# Altium footprint library Elettronica FM.PcbLib: 387 footprints (part 16 of 25)
Each footprint in its own frame and in the unit in brackets; x right, y up, seen from the top. Pads: shape width x height; smd on the part's side, far side on the other; paste and mask are expansions set on the pad; w line width, h text height; cw(c..) or ccw(c..) is an arc to the next point about the centre after c.
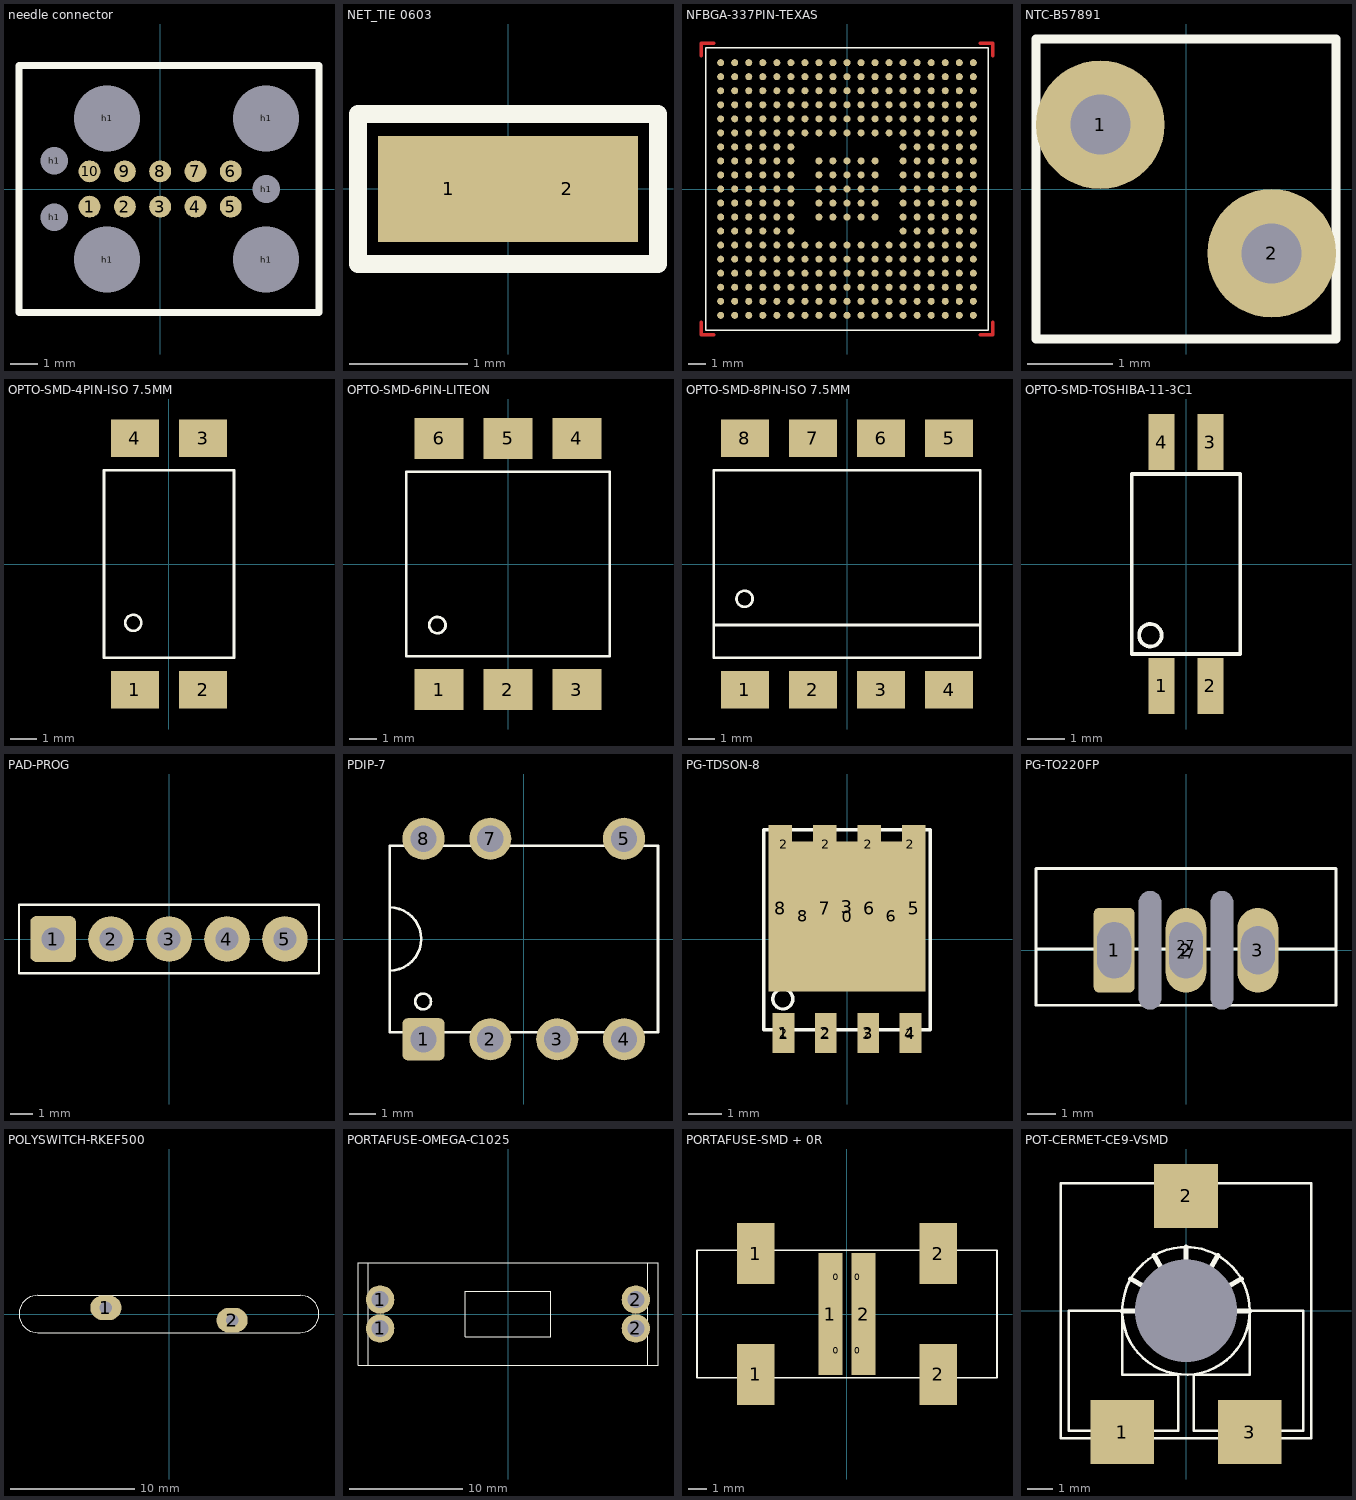
[diagram p15: the footprints below, top view; thin cyan lines are the x and y axes]

## needle connector [mil]
height 590.55
pads (17):
  round 31 smd mask+0: 1(-100,-25) 2(-50,-25) 3(0,-25) 4(50,-25) 5(100,-25) 6(100,25) 7(50,25) 8(0,25) 9(-50,25) 10(-100,25)
  round 19.68 hole 39 unplated: h1(-150,-40) h1(-150,40) h1(150,0)
  round 19.68 hole 93.5 unplated: h1(-75,100) h1(-75,-100) h1(150,-100) h1(150,100)
Top Overlay:
  lines w10: -200,-175 225,-175 225,175 -200,175 -200,-175

## NET_TIE 0603 [mm]
height 40.5
pads (2):
  rect 1.2x0.9 smd: 1(-0.5,0) 2(0.5,0)
Top Overlay:
  lines w0.15: -1.27,-0.635 -1.27,0.635 1.27,0.635 1.27,-0.635 -1.27,-0.635

## NFBGA-337PIN-TEXAS [mm]
height 16.6
pads (337):
  round 0.4 smd paste+0 mask+0.05: A1(-7.2,7.2) A2(-6.4,7.2) A3(-5.6,7.2) A4(-4.8,7.2) A5(-4,7.2) A6(-3.2,7.2) A7(-2.4,7.2) A8(-1.6,7.2) A9(-0.8,7.2) A10(0,7.2) A11(0.8,7.2) A12(1.6,7.2) A13(2.4,7.2) A14(3.2,7.2) A15(4,7.2) A16(4.8,7.2) A17(5.6,7.2) A18(6.4,7.2) A19(7.2,7.2) B1(-7.2,6.4) B2(-6.4,6.4) B3(-5.6,6.4) B4(-4.8,6.4) B5(-4,6.4) B6(-3.2,6.4) B7(-2.4,6.4) B8(-1.6,6.4) B9(-0.8,6.4) B10(0,6.4) B11(0.8,6.4) B12(1.6,6.4) B13(2.4,6.4) B14(3.2,6.4) B15(4,6.4) B16(4.8,6.4) B17(5.6,6.4) B18(6.4,6.4) B19(7.2,6.4) C1(-7.2,5.6) C2(-6.4,5.6) C3(-5.6,5.6) C4(-4.8,5.6) C5(-4,5.6) C6(-3.2,5.6) C7(-2.4,5.6) C8(-1.6,5.6) C9(-0.8,5.6) C10(0,5.6) C11(0.8,5.6) C12(1.6,5.6) C13(2.4,5.6) C14(3.2,5.6) C15(4,5.6) C16(4.8,5.6) C17(5.6,5.6) C18(6.4,5.6) C19(7.2,5.6) D1(-7.2,4.8) D2(-6.4,4.8) D3(-5.6,4.8) D4(-4.8,4.8) D5(-4,4.8) D6(-3.2,4.8) D7(-2.4,4.8) D8(-1.6,4.8) D9(-0.8,4.8) D10(0,4.8) D11(0.8,4.8) D12(1.6,4.8) D13(2.4,4.8) D14(3.2,4.8) D15(4,4.8) D16(4.8,4.8) D17(5.6,4.8) D18(6.4,4.8) D19(7.2,4.8) E1(-7.2,4) E2(-6.4,4) E3(-5.6,4) E4(-4.8,4) E5(-4,4) E6(-3.2,4) E7(-2.4,4) E8(-1.6,4) E9(-0.8,4) E10(0,4) E11(0.8,4) E12(1.6,4) E13(2.4,4) E14(3.2,4) E15(4,4) E16(4.8,4) E17(5.6,4) E18(6.4,4) E19(7.2,4) F1(-7.2,3.2) F2(-6.4,3.2) F3(-5.6,3.2) F4(-4.8,3.2) F5(-4,3.2) F6(-3.2,3.2) F7(-2.4,3.2) F8(-1.6,3.2) F9(-0.8,3.2) F10(0,3.2) F11(0.8,3.2) F12(1.6,3.2) F13(2.4,3.2) F14(3.2,3.2) F15(4,3.2) F16(4.8,3.2) F17(5.6,3.2) F18(6.4,3.2) F19(7.2,3.2) G1(-7.2,2.4) G2(-6.4,2.4) G3(-5.6,2.4) G4(-4.8,2.4) G5(-4,2.4) G6(-3.2,2.4) G14(3.2,2.4) G15(4,2.4) G16(4.8,2.4) G17(5.6,2.4) G18(6.4,2.4) G19(7.2,2.4) H1(-7.2,1.6) H2(-6.4,1.6) H3(-5.6,1.6) H4(-4.8,1.6) H5(-4,1.6) H6(-3.2,1.6) H8(-1.6,1.6) H9(-0.8,1.6) H10(0,1.6) H11(0.8,1.6) H12(1.6,1.6) H14(3.2,1.6) H15(4,1.6) H16(4.8,1.6) H17(5.6,1.6) H18(6.4,1.6) H19(7.2,1.6) J1(-7.2,0.8) J2(-6.4,0.8) J3(-5.6,0.8) J4(-4.8,0.8) J5(-4,0.8) J6(-3.2,0.8) J8(-1.6,0.8) J9(-0.8,0.8) J10(0,0.8) J11(0.8,0.8) J12(1.6,0.8) J14(3.2,0.8) J15(4,0.8) J16(4.8,0.8) J17(5.6,0.8) J18(6.4,0.8) J19(7.2,0.8) K1(-7.2,0) K2(-6.4,0) K3(-5.6,0) K4(-4.8,0) K5(-4,0) K6(-3.2,0) K8(-1.6,0) K9(-0.8,0) K10(0,0) K11(0.8,0) K12(1.6,0) K14(3.2,0) K15(4,0) K16(4.8,0) K17(5.6,0) K18(6.4,0) K19(7.2,0) L1(-7.2,-0.8) L2(-6.4,-0.8) L3(-5.6,-0.8) L4(-4.8,-0.8) L5(-4,-0.8) L6(-3.2,-0.8) L8(-1.6,-0.8) L9(-0.8,-0.8) L10(0,-0.8) L11(0.8,-0.8) L12(1.6,-0.8) L14(3.2,-0.8) L15(4,-0.8) L16(4.8,-0.8) L17(5.6,-0.8) L18(6.4,-0.8) L19(7.2,-0.8) M1(-7.2,-1.6) M2(-6.4,-1.6) M3(-5.6,-1.6) M4(-4.8,-1.6) M5(-4,-1.6) M6(-3.2,-1.6) M8(-1.6,-1.6) M9(-0.8,-1.6) M10(0,-1.6) M11(0.8,-1.6) M12(1.6,-1.6) M14(3.2,-1.6) M15(4,-1.6) M16(4.8,-1.6) M17(5.6,-1.6) M18(6.4,-1.6) M19(7.2,-1.6) N1(-7.2,-2.4) N2(-6.4,-2.4) N3(-5.6,-2.4) N4(-4.8,-2.4) N5(-4,-2.4) N6(-3.2,-2.4) N14(3.2,-2.4) N15(4,-2.4) N16(4.8,-2.4) N17(5.6,-2.4) N18(6.4,-2.4) N19(7.2,-2.4) P1(-7.2,-3.2) P2(-6.4,-3.2) P3(-5.6,-3.2) P4(-4.8,-3.2) P5(-4,-3.2) P6(-3.2,-3.2) P7(-2.4,-3.2) P8(-1.6,-3.2) P9(-0.8,-3.2) P10(0,-3.2) P11(0.8,-3.2) P12(1.6,-3.2) P13(2.4,-3.2) P14(3.2,-3.2) P15(4,-3.2) P16(4.8,-3.2) P17(5.6,-3.2) P18(6.4,-3.2) P19(7.2,-3.2) R1(-7.2,-4) R2(-6.4,-4) R3(-5.6,-4) R4(-4.8,-4) R5(-4,-4) R6(-3.2,-4) R7(-2.4,-4) R8(-1.6,-4) R9(-0.8,-4) R10(0,-4) R11(0.8,-4) R12(1.6,-4) R13(2.4,-4) R14(3.2,-4) R15(4,-4) R16(4.8,-4) R17(5.6,-4) R18(6.4,-4) R19(7.2,-4) T1(-7.2,-4.8) T2(-6.4,-4.8) T3(-5.6,-4.8) T4(-4.8,-4.8) T5(-4,-4.8) T6(-3.2,-4.8) T7(-2.4,-4.8) T8(-1.6,-4.8) T9(-0.8,-4.8) T10(0,-4.8) T11(0.8,-4.8) T12(1.6,-4.8) T13(2.4,-4.8) T14(3.2,-4.8) T15(4,-4.8) T16(4.8,-4.8) T17(5.6,-4.8) T18(6.4,-4.8) T19(7.2,-4.8) U1(-7.2,-5.6) U2(-6.4,-5.6) U3(-5.6,-5.6) U4(-4.8,-5.6) U5(-4,-5.6) U6(-3.2,-5.6) U7(-2.4,-5.6) U8(-1.6,-5.6) U9(-0.8,-5.6) U10(0,-5.6) U11(0.8,-5.6) U12(1.6,-5.6) U13(2.4,-5.6) U14(3.2,-5.6) U15(4,-5.6) U16(4.8,-5.6) U17(5.6,-5.6) U18(6.4,-5.6) U19(7.2,-5.6) V1(-7.2,-6.4) V2(-6.4,-6.4) V3(-5.6,-6.4) V4(-4.8,-6.4) V5(-4,-6.4) V6(-3.2,-6.4) V7(-2.4,-6.4) V8(-1.6,-6.4) V9(-0.8,-6.4) V10(0,-6.4) V11(0.8,-6.4) V12(1.6,-6.4) V13(2.4,-6.4) V14(3.2,-6.4) V15(4,-6.4) V16(4.8,-6.4) V17(5.6,-6.4) V18(6.4,-6.4) V19(7.2,-6.4) W1(-7.2,-7.2) W2(-6.4,-7.2) W3(-5.6,-7.2) W4(-4.8,-7.2) W5(-4,-7.2) W6(-3.2,-7.2) W7(-2.4,-7.2) W8(-1.6,-7.2) W9(-0.8,-7.2) W10(0,-7.2) W11(0.8,-7.2) W12(1.6,-7.2) W13(2.4,-7.2) W14(3.2,-7.2) W15(4,-7.2) W16(4.8,-7.2) W17(5.6,-7.2) W18(6.4,-7.2) W19(7.2,-7.2)
Top Layer:
  lines w0.2: -8.3,-7.6 -8.3,-8.3 -7.6,-8.3 ; -8.3,7.6 -8.3,8.3 -7.6,8.3 ; 7.6,-8.3 8.3,-8.3 8.3,-7.6 ; 7.6,8.3 8.3,8.3 8.3,7.6
Top Overlay:
  lines w0.1: -8.05,-8.05 8.05,-8.05 8.05,8.05 -8.05,8.05 -8.05,-8.05
Top Solder:
  region: -7.35,-8.55 -7.35,-8.05 -8.05,-8.05 -8.05,-7.35 -8.55,-7.35 -8.55,-8.55
  region: 7.35,8.55 7.35,8.05 8.05,8.05 8.05,7.35 8.55,7.35 8.55,8.55
  region: -8.55,7.35 -8.05,7.35 -8.05,8.05 -7.35,8.05 -7.35,8.55 -8.55,8.55
  region: 8.55,-7.35 8.05,-7.35 8.05,-8.05 7.35,-8.05 7.35,-8.55 8.55,-8.55
3D body: height 1.4, standoff 0.45, extent -8.05,-8.05 8.05,8.05

## NTC-B57891 [mm]
pads (2):
  round 1.5 hole 0.7: 1(-1,0.75) 2(1,-0.75)
Top Overlay:
  lines w0.1: -1.75,-1.75 -1.75,1.75 1.75,1.75 1.75,-1.75 -1.75,-1.75

## OPTO-SMD-4PIN-ISO 7.5MM [mm]
pads (4):
  rect 1.8x1.4 smd: 1(-1.27,-4.7) 2(1.27,-4.7) 3(1.27,4.7) 4(-1.27,4.7)
Top Overlay:
  circle w0.1: c-1.333,-2.195 r0.3
  lines w0.1: -2.425,-3.5 -2.425,3.5 2.425,3.5 2.425,-3.5 -2.425,-3.5
3D body: height 4.6, standoff 0.6, extent -2.425,-3.5 2.425,3.5

## OPTO-SMD-6PIN-LITEON [mm]
pads (6):
  rect 1.8x1.5 smd: 1(-2.54,-4.625) 2(0,-4.625) 3(2.54,-4.625) 4(2.54,4.625) 5(0,4.625) 6(-2.54,4.625)
Top Overlay:
  circle w0.1: c-2.6,-2.25 r0.3
  lines w0.1: -3.75,-3.4 -3.75,3.4 3.75,3.4 3.75,-3.4 -3.75,-3.4
3D body: height 5.1, standoff 0.6, extent -3.75,-3.4 3.75,3.4

## OPTO-SMD-8PIN-ISO 7.5MM [mm]
pads (8):
  rect 1.8x1.4 smd: 1(-3.81,-4.7) 2(-1.27,-4.7) 3(1.27,-4.7) 4(3.81,-4.7) 5(3.81,4.7) 6(1.27,4.7) 7(-1.27,4.7) 8(-3.81,4.7)
Top Overlay:
  circle w0.1: c-3.825,-1.3 r0.3
  lines w0.1: -4.975,-2.275 4.975,-2.275 ; -4.975,-3.5 -4.975,3.5 4.975,3.5 4.975,-3.5 -4.975,-3.5
3D body: height 4.6, standoff 0.6, extent -4.965,-3.5 4.975,3.5

## OPTO-SMD-TOSHIBA-11-3C1 [mm]
pads (4):
  rect 0.7x1.5 smd: 1(-0.65,-3.25) 2(0.65,-3.25) 3(0.65,3.25) 4(-0.65,3.25)
Top Overlay:
  circle w0.1: c-0.95,-1.9 r0.3
  lines w0.1: -1.45,-2.4 1.45,-2.4 1.45,2.4 -1.45,2.4 -1.45,-2.4
3D body: height 2.2, standoff 0.1, extent -1.45,-2.4 1.45,2.4

## PAD-PROG [mm]
height 16
pads (5):
  rrect25% 2x2 hole 1 mask+0.1: 1(-5.08,0)
  round 2 hole 1 mask+0.1: 2(-2.54,0) 3(0,0) 4(2.54,0) 5(5.08,0)
Top Overlay:
  lines w0.1: -6.575,-1.5 -6.575,1.5 6.575,1.5 6.575,-1.5 -6.575,-1.5
Bottom Overlay:
  lines w0.1: -6.575,-1.5 6.575,-1.5 6.575,1.5 -6.575,1.5 -6.575,-1.5

## PDIP-7 [mm]
height 8.5
pads (7):
  rrect25% 1.6x1.6 hole 1: 1(-3.81,-3.81)
  round 1.6 hole 1: 2(-1.27,-3.81) 3(1.27,-3.81) 4(3.81,-3.81) 5(3.81,3.81) 7(-1.27,3.81) 8(-3.81,3.81)
Top Overlay:
  circle w0.1: c-3.825,-2.375 r0.3
  lines w0.1: -5.1,-1.2 ccw(c-5.1,0) -5.1,1.2 ; -5.1,-3.55 5.1,-3.55 5.1,3.55 -5.1,3.55 -5.1,-3.55

## PG-TDSON-8 [mm]
pads (20):
  rect 0.63x4.5 smd mask+0: 0(0,0.675)
  rect 0.65x1.2 smd mask+0: 1(-1.905,-2.825) 2(-0.635,-2.825) 3(0.635,-2.825) 4(1.905,-2.825)
  rect 0.5x0.9 on Top Overlay mask+0.1: 2(-1.905,-2.825) 2(-1.905,2.85) 2(-0.635,-2.825) 2(-0.635,2.85) 2(0.635,-2.825) 2(0.635,2.85) 2(1.905,-2.825) 2(1.905,2.85)
  rect 4.3x3.8 on Top Overlay mask+0.1: 3(0,0.975)
  rect 0.7x5 smd mask+0: 5(2,0.925) 6(0.665,0.925) 7(-0.665,0.925) 8(-2,0.925)
  rect 0.635x4.5 smd mask+0: 6(1.332,0.675) 8(-1.332,0.675)
Top Overlay:
  circle w0.1: c-1.925,-1.8 r0.3
  lines w0.1: -2.5,-2.725 -2.5,3.275 2.5,3.275 2.5,-2.725 -2.5,-2.725

## PG-TO220FP [mm]
pads (7):
  rrect25% 0x0 hole 0.8 slot 4.2 at 90 deg unplated: 0(-1.275,0) 0(1.275,0)
  rrect25% 1.45x3 hole 1.2 slot 2 at 90 deg: 1(-2.55,0)
  oval 1.45x3 hole 1.2 slot 2 at 90 deg: 2(0,0)
  oval 1.45x3 hole 1.2 slot 1.7 at 90 deg: 3(2.55,0)
  rect 0.9x0.65 on Top Overlay paste+0 mask+0.05: 27(0,-0.125) 27(0,0.175)
Top Overlay:
  lines w0.1: -5.325,0.05 5.325,0.05 ; -5.325,-1.95 -5.325,2.9 5.325,2.9 5.325,-1.95 -5.325,-1.95
3D body: height 3.23, standoff 0, extent -0.75,-0.3 0.75,0.3
3D body: height 9.85, standoff 3.45, extent -5.325,-1.95 5.325,0.05
3D body: height 16.15, standoff 3.45, extent -5.325,0.05 5.325,2.9
3D body: height 0, standoff -4.1, extent -0.425,-0.3 0.425,0.3
3D body: height 14.3, standoff 11, extent -1.65,0 1.65,2.95
3D body: height 0, standoff -4.1, extent -2.965,-0.3 -2.115,0.3
3D body: height 3.23, standoff 0, extent -3.29,-0.3 -1.79,0.3
3D body: height 0, standoff -4.1, extent 2.115,-0.3 2.965,0.3
3D body: height 3.23, standoff 0, extent 1.79,-0.3 3.29,0.3

## POLYSWITCH-RKEF500 [mm]
pads (2):
  oval 2.5x2 hole 1: 1(-5.075,0.5) 2(5.075,-0.5)
Top Overlay:
  lines w0.1: -10.55,-1.5 cw(c-10.55,0) -10.55,1.5 10.55,1.5 cw(c10.55,0) 10.55,-1.5 -10.55,-1.5
3D body: height 31, standoff 2, extent -10.5,-1.497 10.5,1.497
3D body: height 31, standoff 2, extent -11.988,-1.497 -9,1.497
3D body: height 0, standoff -3, extent -5.397,0.601 -4.6,1.399
3D body: height 0, standoff -3, extent 4.603,-1.399 5.4,-0.601
3D body: height 31, standoff 2, extent 9.012,-1.497 12,1.497
3D body: height 5, standoff 0, extent 3.78,-1.5 6.37,1.095
3D body: height 5, standoff 0, extent -6.37,-1.095 -3.78,1.5

## PORTAFUSE-OMEGA-C1025 [mm]
pads (4):
  round 2.5 hole 1.5: 1(-11.25,-1.27) 1(-11.25,1.27) 2(11.25,-1.27) 2(11.25,1.27)
Top Overlay:
  lines w0.1: -12.3,-4.5 12.3,-4.5 ; -12.3,-4.5 -12.3,4.5 ; -12.3,-4.5 -13.2,-4.5 -13.2,4.5 -12.3,4.5 ; -12.3,4.5 12.3,4.5 ; 12.3,-4.5 12.3,4.5 ; 12.3,-4.5 13.2,-4.5 13.2,4.5 12.3,4.5 ; -3.75,-2 3.75,-2 3.75,2 -3.75,2 -3.75,-2
3D body: height 12.2, standoff 0, extent -13.2,-4.5 13.2,4.5

## PORTAFUSE-SMD + 0R [mm]
height 16.6
pads (10):
  rect 0.65x2.6 on Top Solder mask+0.1: 0(-0.575,-2) 0(-0.575,2) 0(0.575,-2) 0(0.575,2)
  rect 2.032x3.302 smd mask+0.1: 1(-4.95,-3.275) 1(-4.95,3.275) 2(4.95,-3.275) 2(4.95,3.275)
  rect 1.3x6.6 smd paste-7: 1(-0.9,0) 2(0.9,0)
Top Overlay:
  lines w0.1: -8.125,-3.45 8.125,-3.45 8.125,3.45 -8.125,3.45 -8.125,-3.45
3D body "keystone-PN3588.STEP": height 7.84, standoff -0.04, extent -8.002,-4.378 8,4.378
3D body: height 18.5, standoff 0, extent -5.7,-2.15 5.7,2.15
3D body "res1206r.STEP": height 0.55, standoff 0, extent -0.8,-1.575 0.8,1.525

## POT-CERMET-CE9-VSMD [mm]
pads (4):
  round 0 hole 4 unplated mask+0.1: 0(0,0)
  rect 2.5x2.5 smd: 1(-2.5,-4.75) 2(0,4.5) 3(2.5,-4.75)
Top Overlay:
  circle w0.1: c0,0 r2.5
  circle w0.1: c0,0 r1.5
  lines w0.1: -3.5,-5 -3.5,-4.7 -4.6,-4.7 -4.6,0 -2.5,0 -2.5,-2.5 -0.3,-2.5 -0.3,-4.7 -1.5,-4.7 -1.5,-5 ; 1.5,-5 1.5,-4.7 0.3,-4.7 0.3,-2.5 2.5,-2.5 2.5,0 4.6,0 4.6,-4.7 3.5,-4.7 3.5,-5 ; -4.9,-5 4.9,-5 4.9,5 -4.9,5 -4.9,-5
  lines w0.2: -2.5,0 -1.7,0 ; -2.165,1.25 -1.472,0.85 ; -1.25,2.165 -0.85,1.472 ; 0,1.7 0,2.5 ; 0.85,1.472 1.25,2.165 ; 1.472,0.85 2.165,1.25 ; 1.7,0 2.5,0
3D body: height 5.5, standoff 0.8, extent -4.9,-5 4.9,5